# Altium footprint library 2.10-LQFP封装.PcbLib: 109 footprints (part 7 of 8)
Each footprint in its own frame and in the unit in brackets; x right, y up, seen from the top. Pads: shape width x height; smd on the part's side, far side on the other; paste and mask are expansions set on the pad; w line width, h text height; cw(c..) or ccw(c..) is an arc to the next point about the centre after c.
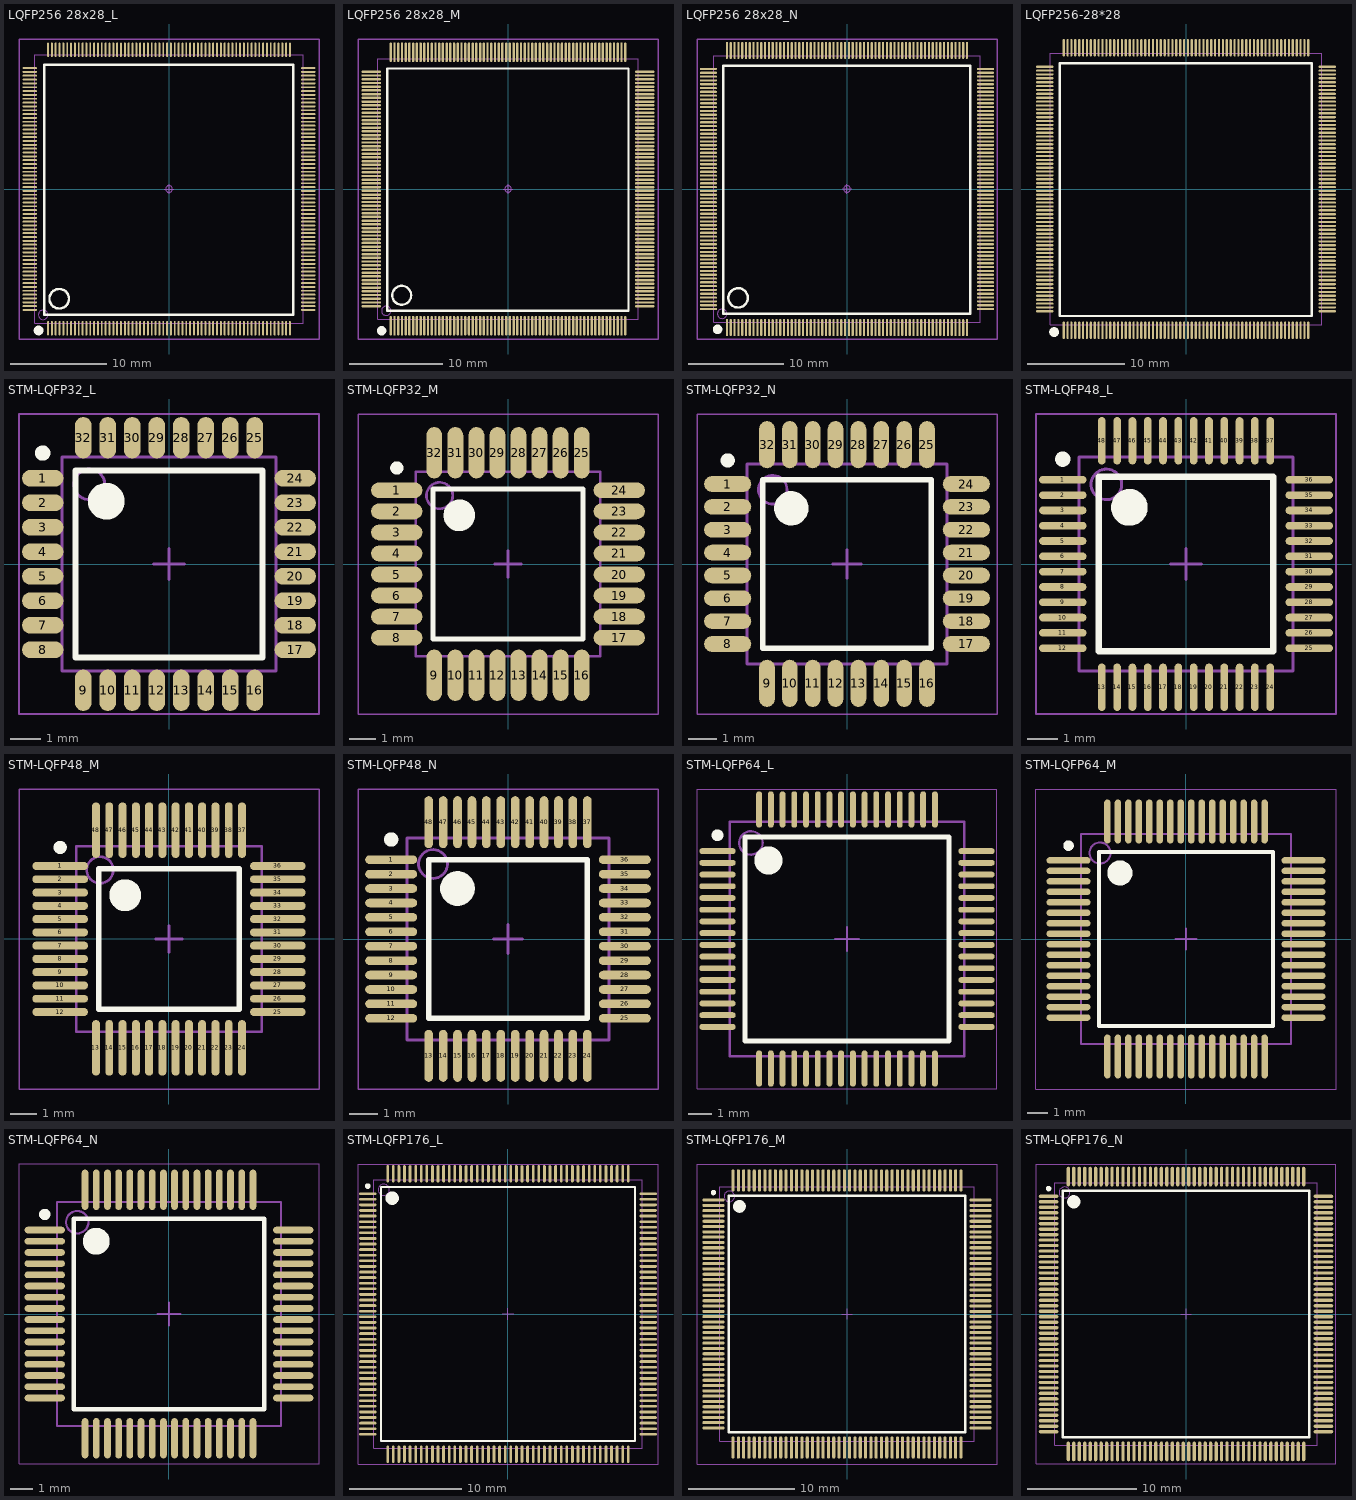
[diagram p6: the footprints below, top view; thin cyan lines are the x and y axes]

## LQFP256 28x28_L [mm] "256脚，体宽28x28mm，脚距0.4mm      [ PCB学习群514746572 ]"
pads (256):
  oval 0.2x1.5 smd: 1(-12.605,-14.497) 2(-12.205,-14.497) 3(-11.805,-14.497) 4(-11.405,-14.497) 5(-11.005,-14.497) 6(-10.605,-14.497) 7(-10.205,-14.497) 8(-9.805,-14.497) 9(-9.405,-14.497) 10(-9.005,-14.497) 11(-8.605,-14.497) 12(-8.205,-14.497) 13(-7.805,-14.497) 14(-7.405,-14.497) 15(-7.005,-14.497) 16(-6.605,-14.497) 17(-6.205,-14.497) 18(-5.805,-14.497) 19(-5.405,-14.497) 20(-5.005,-14.497) 21(-4.605,-14.497) 22(-4.205,-14.497) 23(-3.805,-14.497) 24(-3.405,-14.497) 25(-3.005,-14.497) 26(-2.605,-14.497) 27(-2.205,-14.497) 28(-1.805,-14.497) 29(-1.405,-14.497) 30(-1.005,-14.497) 31(-0.605,-14.497) 32(-0.205,-14.497) 33(0.195,-14.497) 34(0.595,-14.497) 35(0.995,-14.497) 36(1.395,-14.497) 37(1.795,-14.497) 38(2.195,-14.497) 39(2.595,-14.497) 40(2.995,-14.497) 41(3.395,-14.497) 42(3.795,-14.497) 43(4.195,-14.497) 44(4.595,-14.497) 45(4.995,-14.497) 46(5.395,-14.497) 47(5.795,-14.497) 48(6.195,-14.497) 49(6.595,-14.497) 50(6.995,-14.497) 51(7.395,-14.497) 52(7.795,-14.497) 53(8.195,-14.497) 54(8.595,-14.497) 55(8.995,-14.497) 56(9.395,-14.497) 57(9.795,-14.497) 58(10.195,-14.497) 59(10.595,-14.497) 60(10.995,-14.497) 61(11.395,-14.497) 62(11.795,-14.497) 63(12.195,-14.497) 64(12.595,-14.497) 129(12.595,14.5) 130(12.195,14.5) 131(11.795,14.5) 132(11.395,14.5) 133(10.995,14.5) 134(10.595,14.5) 135(10.195,14.5) 136(9.795,14.5) 137(9.395,14.5) 138(8.995,14.5) 139(8.595,14.5) 140(8.195,14.5) 141(7.795,14.5) 142(7.395,14.5) 143(6.995,14.5) 144(6.595,14.5) 145(6.195,14.5) 146(5.795,14.5) 147(5.395,14.5) 148(4.995,14.5) 149(4.595,14.5) 150(4.195,14.5) 151(3.795,14.5) 152(3.395,14.5) 153(2.995,14.5) 154(2.595,14.5) 155(2.195,14.5) 156(1.795,14.5) 157(1.395,14.5) 158(0.995,14.5) 159(0.595,14.5) 160(0.195,14.5) 161(-0.205,14.5) 162(-0.605,14.5) 163(-1.005,14.5) 164(-1.405,14.5) 165(-1.805,14.5) 166(-2.205,14.5) 167(-2.605,14.5) 168(-3.005,14.5) 169(-3.405,14.5) 170(-3.805,14.5) 171(-4.205,14.5) 172(-4.605,14.5) 173(-5.005,14.5) 174(-5.405,14.5) 175(-5.805,14.5) 176(-6.205,14.5) 177(-6.605,14.5) 178(-7.005,14.5) 179(-7.405,14.5) 180(-7.805,14.5) 181(-8.205,14.5) 182(-8.605,14.5) 183(-9.005,14.5) 184(-9.405,14.5) 185(-9.805,14.5) 186(-10.205,14.5) 187(-10.605,14.5) 188(-11.005,14.5) 189(-11.405,14.5) 190(-11.805,14.5) 191(-12.205,14.5) 192(-12.605,14.5)
  oval 1.5x0.2 smd: 65(14.493,-12.598) 66(14.493,-12.198) 67(14.493,-11.798) 68(14.493,-11.398) 69(14.493,-10.998) 70(14.493,-10.598) 71(14.493,-10.198) 72(14.493,-9.798) 73(14.493,-9.398) 74(14.493,-8.998) 75(14.493,-8.598) 76(14.493,-8.198) 77(14.493,-7.798) 78(14.493,-7.398) 79(14.493,-6.998) 80(14.493,-6.598) 81(14.493,-6.198) 82(14.493,-5.798) 83(14.493,-5.398) 84(14.493,-4.998) 85(14.493,-4.598) 86(14.493,-4.198) 87(14.493,-3.798) 88(14.493,-3.398) 89(14.493,-2.998) 90(14.493,-2.598) 91(14.493,-2.198) 92(14.493,-1.798) 93(14.493,-1.398) 94(14.493,-0.998) 95(14.493,-0.598) 96(14.493,-0.198) 97(14.493,0.202) 98(14.493,0.602) 99(14.493,1.002) 100(14.493,1.402) 101(14.493,1.802) 102(14.493,2.202) 103(14.493,2.602) 104(14.493,3.002) 105(14.493,3.402) 106(14.493,3.802) 107(14.493,4.202) 108(14.493,4.602) 109(14.493,5.002) 110(14.493,5.402) 111(14.493,5.802) 112(14.493,6.202) 113(14.493,6.602) 114(14.493,7.002) 115(14.493,7.402) 116(14.493,7.802) 117(14.493,8.202) 118(14.493,8.602) 119(14.493,9.002) 120(14.493,9.402) 121(14.493,9.802) 122(14.493,10.202) 123(14.493,10.602) 124(14.493,11.002) 125(14.493,11.402) 126(14.493,11.802) 127(14.493,12.202) 128(14.493,12.602) 193(-14.503,12.602) 194(-14.503,12.202) 195(-14.503,11.802) 196(-14.503,11.402) 197(-14.503,11.002) 198(-14.503,10.602) 199(-14.503,10.202) 200(-14.503,9.802) 201(-14.503,9.402) 202(-14.503,9.002) 203(-14.503,8.602) 204(-14.503,8.202) 205(-14.503,7.802) 206(-14.503,7.402) 207(-14.503,7.002) 208(-14.503,6.602) 209(-14.503,6.202) 210(-14.503,5.802) 211(-14.503,5.402) 212(-14.503,5.002) 213(-14.503,4.602) 214(-14.503,4.202) 215(-14.503,3.802) 216(-14.503,3.402) 217(-14.503,3.002) 218(-14.503,2.602) 219(-14.503,2.202) 220(-14.503,1.802) 221(-14.503,1.402) 222(-14.503,1.002) 223(-14.503,0.602) 224(-14.503,0.202) 225(-14.503,-0.198) 226(-14.503,-0.598) 227(-14.503,-0.998) 228(-14.503,-1.398) 229(-14.503,-1.798) 230(-14.503,-2.198) 231(-14.503,-2.598) 232(-14.503,-2.998) 233(-14.503,-3.398) 234(-14.503,-3.798) 235(-14.503,-4.198) 236(-14.503,-4.598) 237(-14.503,-4.998) 238(-14.503,-5.398) 239(-14.503,-5.798) 240(-14.503,-6.198) 241(-14.503,-6.598) 242(-14.503,-6.998) 243(-14.503,-7.398) 244(-14.503,-7.798) 245(-14.503,-8.198) 246(-14.503,-8.598) 247(-14.503,-8.998) 248(-14.503,-9.398) 249(-14.503,-9.798) 250(-14.503,-10.198) 251(-14.503,-10.598) 252(-14.503,-10.998) 253(-14.503,-11.398) 254(-14.503,-11.798) 255(-14.503,-12.198) 256(-14.503,-12.598)
Top Overlay:
  circle w0.508: c-13.589,-14.732 r0.25
  circle w0.254: c-11.435,-11.428 r1.016
  lines w0.254: -13.005,-13.079 12.949,-13.079 12.949,12.956 -13.005,12.956 -13.005,-13.079
Mechanical 13:
  circle w0.1: c-13.105,-13.098 r0.5
  lines w0.1: -14.005,-13.998 13.995,-13.998 13.995,14.002 -14.005,14.002 -14.005,-13.998
Mechanical 15:
  circle w0.05: c-0.005,0.002 r0.35
  lines w0.05: -0.505,0.002 0.495,0.002 ; -0.005,-0.498 -0.005,0.502
  lines w0.15: -15.626,-15.619 15.616,-15.619 15.616,15.623 -15.626,15.623 -15.626,-15.619
3D body "lqfp256-28x28_asm-22.stp": height 1.45, standoff 0, extent -15.003,-15.003 15.003,15.003

## LQFP256 28x28_M [mm] "256脚，体宽28x28mm，脚距0.4mm      [ PCB学习群514746572 ]"
pads (256):
  oval 0.26x2.1 smd: 1(-12.6,-14.702) 2(-12.2,-14.702) 3(-11.8,-14.702) 4(-11.4,-14.702) 5(-11,-14.702) 6(-10.6,-14.702) 7(-10.2,-14.702) 8(-9.8,-14.702) 9(-9.4,-14.702) 10(-9,-14.702) 11(-8.6,-14.702) 12(-8.2,-14.702) 13(-7.8,-14.702) 14(-7.4,-14.702) 15(-7,-14.702) 16(-6.6,-14.702) 17(-6.2,-14.702) 18(-5.8,-14.702) 19(-5.4,-14.702) 20(-5,-14.702) 21(-4.6,-14.702) 22(-4.2,-14.702) 23(-3.8,-14.702) 24(-3.4,-14.702) 25(-3,-14.702) 26(-2.6,-14.702) 27(-2.2,-14.702) 28(-1.8,-14.702) 29(-1.4,-14.702) 30(-1,-14.702) 31(-0.6,-14.702) 32(-0.2,-14.702) 33(0.2,-14.702) 34(0.6,-14.702) 35(1,-14.702) 36(1.4,-14.702) 37(1.8,-14.702) 38(2.2,-14.702) 39(2.6,-14.702) 40(3,-14.702) 41(3.4,-14.702) 42(3.8,-14.702) 43(4.2,-14.702) 44(4.6,-14.702) 45(5,-14.702) 46(5.4,-14.702) 47(5.8,-14.702) 48(6.2,-14.702) 49(6.6,-14.702) 50(7,-14.702) 51(7.4,-14.702) 52(7.8,-14.702) 53(8.2,-14.702) 54(8.6,-14.702) 55(9,-14.702) 56(9.4,-14.702) 57(9.8,-14.702) 58(10.2,-14.702) 59(10.6,-14.702) 60(11,-14.702) 61(11.4,-14.702) 62(11.8,-14.702) 63(12.2,-14.702) 64(12.6,-14.702) 129(12.6,14.702) 130(12.2,14.702) 131(11.8,14.702) 132(11.4,14.702) 133(11,14.702) 134(10.6,14.702) 135(10.2,14.702) 136(9.8,14.702) 137(9.4,14.702) 138(9,14.702) 139(8.6,14.702) 140(8.2,14.702) 141(7.8,14.702) 142(7.4,14.702) 143(7,14.702) 144(6.6,14.702) 145(6.2,14.702) 146(5.8,14.702) 147(5.4,14.702) 148(5,14.702) 149(4.6,14.702) 150(4.2,14.702) 151(3.8,14.702) 152(3.4,14.702) 153(3,14.702) 154(2.6,14.702) 155(2.2,14.702) 156(1.8,14.702) 157(1.4,14.702) 158(1,14.702) 159(0.6,14.702) 160(0.2,14.702) 161(-0.2,14.702) 162(-0.6,14.702) 163(-1,14.702) 164(-1.4,14.702) 165(-1.8,14.702) 166(-2.2,14.702) 167(-2.6,14.702) 168(-3,14.702) 169(-3.4,14.702) 170(-3.8,14.702) 171(-4.2,14.702) 172(-4.6,14.702) 173(-5,14.702) 174(-5.4,14.702) 175(-5.8,14.702) 176(-6.2,14.702) 177(-6.6,14.702) 178(-7,14.702) 179(-7.4,14.702) 180(-7.8,14.702) 181(-8.2,14.702) 182(-8.6,14.702) 183(-9,14.702) 184(-9.4,14.702) 185(-9.8,14.702) 186(-10.2,14.702) 187(-10.6,14.702) 188(-11,14.702) 189(-11.4,14.702) 190(-11.8,14.702) 191(-12.2,14.702) 192(-12.6,14.702)
  oval 2.1x0.26 smd: 65(14.702,-12.6) 66(14.702,-12.2) 67(14.702,-11.8) 68(14.702,-11.4) 69(14.702,-11) 70(14.702,-10.6) 71(14.702,-10.2) 72(14.702,-9.8) 73(14.702,-9.4) 74(14.702,-9) 75(14.702,-8.6) 76(14.702,-8.2) 77(14.702,-7.8) 78(14.702,-7.4) 79(14.702,-7) 80(14.702,-6.6) 81(14.702,-6.2) 82(14.702,-5.8) 83(14.702,-5.4) 84(14.702,-5) 85(14.702,-4.6) 86(14.702,-4.2) 87(14.702,-3.8) 88(14.702,-3.4) 89(14.702,-3) 90(14.702,-2.6) 91(14.702,-2.2) 92(14.702,-1.8) 93(14.702,-1.4) 94(14.702,-1) 95(14.702,-0.6) 96(14.702,-0.2) 97(14.702,0.2) 98(14.702,0.6) 99(14.702,1) 100(14.702,1.4) 101(14.702,1.8) 102(14.702,2.2) 103(14.702,2.6) 104(14.702,3) 105(14.702,3.4) 106(14.702,3.8) 107(14.702,4.2) 108(14.702,4.6) 109(14.702,5) 110(14.702,5.4) 111(14.702,5.8) 112(14.702,6.2) 113(14.702,6.6) 114(14.702,7) 115(14.702,7.4) 116(14.702,7.8) 117(14.702,8.2) 118(14.702,8.6) 119(14.702,9) 120(14.702,9.4) 121(14.702,9.8) 122(14.702,10.2) 123(14.702,10.6) 124(14.702,11) 125(14.702,11.4) 126(14.702,11.8) 127(14.702,12.2) 128(14.702,12.6) 193(-14.702,12.6) 194(-14.702,12.2) 195(-14.702,11.8) 196(-14.702,11.4) 197(-14.702,11) 198(-14.702,10.6) 199(-14.702,10.2) 200(-14.702,9.8) 201(-14.702,9.4) 202(-14.702,9) 203(-14.702,8.6) 204(-14.702,8.2) 205(-14.702,7.8) 206(-14.702,7.4) 207(-14.702,7) 208(-14.702,6.6) 209(-14.702,6.2) 210(-14.702,5.8) 211(-14.702,5.4) 212(-14.702,5) 213(-14.702,4.6) 214(-14.702,4.2) 215(-14.702,3.8) 216(-14.702,3.4) 217(-14.702,3) 218(-14.702,2.6) 219(-14.702,2.2) 220(-14.702,1.8) 221(-14.702,1.4) 222(-14.702,1) 223(-14.702,0.6) 224(-14.702,0.2) 225(-14.702,-0.2) 226(-14.702,-0.6) 227(-14.702,-1) 228(-14.702,-1.4) 229(-14.702,-1.8) 230(-14.702,-2.2) 231(-14.702,-2.6) 232(-14.702,-3) 233(-14.702,-3.4) 234(-14.702,-3.8) 235(-14.702,-4.2) 236(-14.702,-4.6) 237(-14.702,-5) 238(-14.702,-5.4) 239(-14.702,-5.8) 240(-14.702,-6.2) 241(-14.702,-6.6) 242(-14.702,-7) 243(-14.702,-7.4) 244(-14.702,-7.8) 245(-14.702,-8.2) 246(-14.702,-8.6) 247(-14.702,-9) 248(-14.702,-9.4) 249(-14.702,-9.8) 250(-14.702,-10.2) 251(-14.702,-10.6) 252(-14.702,-11) 253(-14.702,-11.4) 254(-14.702,-11.8) 255(-14.702,-12.2) 256(-14.702,-12.6)
Top Overlay:
  circle w0.508: c-13.589,-15.24 r0.25
  circle w0.254: c-11.43,-11.43 r1.016
  lines w0.254: -13,-13.081 12.954,-13.081 12.954,12.954 -13,12.954 -13,-13.081
Mechanical 13:
  circle w0.1: c-13.1,-13.1 r0.5
  lines w0.1: -14,-14 14,-14 14,14 -14,14 -14,-14
Mechanical 15:
  circle w0.05: c0,0 r0.35
  lines w0.05: -0.5,0 0.5,0 ; 0,-0.5 0,0.5
  lines w0.15: -16.129,-16.129 16.129,-16.129 16.129,16.129 -16.129,16.129 -16.129,-16.129
3D body "LQFP256-28x28.STEP": height 1.45, standoff 0, extent -15.003,-15.003 15.003,15.003

## LQFP256 28x28_N [mm] "256脚，体宽28x28mm，脚距0.4mm     [ PCB学习群514746572 ]"
pads (256):
  oval 0.23x1.8 smd: 1(-12.605,-14.548) 2(-12.205,-14.548) 3(-11.805,-14.548) 4(-11.405,-14.548) 5(-11.005,-14.548) 6(-10.605,-14.548) 7(-10.205,-14.548) 8(-9.805,-14.548) 9(-9.405,-14.548) 10(-9.005,-14.548) 11(-8.605,-14.548) 12(-8.205,-14.548) 13(-7.805,-14.548) 14(-7.405,-14.548) 15(-7.005,-14.548) 16(-6.605,-14.548) 17(-6.205,-14.548) 18(-5.805,-14.548) 19(-5.405,-14.548) 20(-5.005,-14.548) 21(-4.605,-14.548) 22(-4.205,-14.548) 23(-3.805,-14.548) 24(-3.405,-14.548) 25(-3.005,-14.548) 26(-2.605,-14.548) 27(-2.205,-14.548) 28(-1.805,-14.548) 29(-1.405,-14.548) 30(-1.005,-14.548) 31(-0.605,-14.548) 32(-0.205,-14.548) 33(0.195,-14.548) 34(0.595,-14.548) 35(0.995,-14.548) 36(1.395,-14.548) 37(1.795,-14.548) 38(2.195,-14.548) 39(2.595,-14.548) 40(2.995,-14.548) 41(3.395,-14.548) 42(3.795,-14.548) 43(4.195,-14.548) 44(4.595,-14.548) 45(4.995,-14.548) 46(5.395,-14.548) 47(5.795,-14.548) 48(6.195,-14.548) 49(6.595,-14.548) 50(6.995,-14.548) 51(7.395,-14.548) 52(7.795,-14.548) 53(8.195,-14.548) 54(8.595,-14.548) 55(8.995,-14.548) 56(9.395,-14.548) 57(9.795,-14.548) 58(10.195,-14.548) 59(10.595,-14.548) 60(10.995,-14.548) 61(11.395,-14.548) 62(11.795,-14.548) 63(12.195,-14.548) 64(12.595,-14.548) 129(12.595,14.551) 130(12.195,14.551) 131(11.795,14.551) 132(11.395,14.551) 133(10.995,14.551) 134(10.595,14.551) 135(10.195,14.551) 136(9.795,14.551) 137(9.395,14.551) 138(8.995,14.551) 139(8.595,14.551) 140(8.195,14.551) 141(7.795,14.551) 142(7.395,14.551) 143(6.995,14.551) 144(6.595,14.551) 145(6.195,14.551) 146(5.795,14.551) 147(5.395,14.551) 148(4.995,14.551) 149(4.595,14.551) 150(4.195,14.551) 151(3.795,14.551) 152(3.395,14.551) 153(2.995,14.551) 154(2.595,14.551) 155(2.195,14.551) 156(1.795,14.551) 157(1.395,14.551) 158(0.995,14.551) 159(0.595,14.551) 160(0.195,14.551) 161(-0.205,14.551) 162(-0.605,14.551) 163(-1.005,14.551) 164(-1.405,14.551) 165(-1.805,14.551) 166(-2.205,14.551) 167(-2.605,14.551) 168(-3.005,14.551) 169(-3.405,14.551) 170(-3.805,14.551) 171(-4.205,14.551) 172(-4.605,14.551) 173(-5.005,14.551) 174(-5.405,14.551) 175(-5.805,14.551) 176(-6.205,14.551) 177(-6.605,14.551) 178(-7.005,14.551) 179(-7.405,14.551) 180(-7.805,14.551) 181(-8.205,14.551) 182(-8.605,14.551) 183(-9.005,14.551) 184(-9.405,14.551) 185(-9.805,14.551) 186(-10.205,14.551) 187(-10.605,14.551) 188(-11.005,14.551) 189(-11.405,14.551) 190(-11.805,14.551) 191(-12.205,14.551) 192(-12.605,14.551)
  oval 1.8x0.23 smd: 65(14.544,-12.598) 66(14.544,-12.198) 67(14.544,-11.798) 68(14.544,-11.398) 69(14.544,-10.998) 70(14.544,-10.598) 71(14.544,-10.198) 72(14.544,-9.798) 73(14.544,-9.398) 74(14.544,-8.998) 75(14.544,-8.598) 76(14.544,-8.198) 77(14.544,-7.798) 78(14.544,-7.398) 79(14.544,-6.998) 80(14.544,-6.598) 81(14.544,-6.198) 82(14.544,-5.798) 83(14.544,-5.398) 84(14.544,-4.998) 85(14.544,-4.598) 86(14.544,-4.198) 87(14.544,-3.798) 88(14.544,-3.398) 89(14.544,-2.998) 90(14.544,-2.598) 91(14.544,-2.198) 92(14.544,-1.798) 93(14.544,-1.398) 94(14.544,-0.998) 95(14.544,-0.598) 96(14.544,-0.198) 97(14.544,0.202) 98(14.544,0.602) 99(14.544,1.002) 100(14.544,1.402) 101(14.544,1.802) 102(14.544,2.202) 103(14.544,2.602) 104(14.544,3.002) 105(14.544,3.402) 106(14.544,3.802) 107(14.544,4.202) 108(14.544,4.602) 109(14.544,5.002) 110(14.544,5.402) 111(14.544,5.802) 112(14.544,6.202) 113(14.544,6.602) 114(14.544,7.002) 115(14.544,7.402) 116(14.544,7.802) 117(14.544,8.202) 118(14.544,8.602) 119(14.544,9.002) 120(14.544,9.402) 121(14.544,9.802) 122(14.544,10.202) 123(14.544,10.602) 124(14.544,11.002) 125(14.544,11.402) 126(14.544,11.802) 127(14.544,12.202) 128(14.544,12.602) 193(-14.554,12.602) 194(-14.554,12.202) 195(-14.554,11.802) 196(-14.554,11.402) 197(-14.554,11.002) 198(-14.554,10.602) 199(-14.554,10.202) 200(-14.554,9.802) 201(-14.554,9.402) 202(-14.554,9.002) 203(-14.554,8.602) 204(-14.554,8.202) 205(-14.554,7.802) 206(-14.554,7.402) 207(-14.554,7.002) 208(-14.554,6.602) 209(-14.554,6.202) 210(-14.554,5.802) 211(-14.554,5.402) 212(-14.554,5.002) 213(-14.554,4.602) 214(-14.554,4.202) 215(-14.554,3.802) 216(-14.554,3.402) 217(-14.554,3.002) 218(-14.554,2.602) 219(-14.554,2.202) 220(-14.554,1.802) 221(-14.554,1.402) 222(-14.554,1.002) 223(-14.554,0.602) 224(-14.554,0.202) 225(-14.554,-0.198) 226(-14.554,-0.598) 227(-14.554,-0.998) 228(-14.554,-1.398) 229(-14.554,-1.798) 230(-14.554,-2.198) 231(-14.554,-2.598) 232(-14.554,-2.998) 233(-14.554,-3.398) 234(-14.554,-3.798) 235(-14.554,-4.198) 236(-14.554,-4.598) 237(-14.554,-4.998) 238(-14.554,-5.398) 239(-14.554,-5.798) 240(-14.554,-6.198) 241(-14.554,-6.598) 242(-14.554,-6.998) 243(-14.554,-7.398) 244(-14.554,-7.798) 245(-14.554,-8.198) 246(-14.554,-8.598) 247(-14.554,-8.998) 248(-14.554,-9.398) 249(-14.554,-9.798) 250(-14.554,-10.198) 251(-14.554,-10.598) 252(-14.554,-10.998) 253(-14.554,-11.398) 254(-14.554,-11.798) 255(-14.554,-12.198) 256(-14.554,-12.598)
Top Overlay:
  circle w0.508: c-13.589,-14.732 r0.25
  circle w0.254: c-11.435,-11.428 r1.016
  lines w0.254: -13.005,-13.079 12.949,-13.079 12.949,12.956 -13.005,12.956 -13.005,-13.079
Mechanical 13:
  circle w0.1: c-13.105,-13.098 r0.5
  lines w0.1: -14.005,-13.998 13.995,-13.998 13.995,14.002 -14.005,14.002 -14.005,-13.998
Mechanical 15:
  circle w0.05: c-0.005,0.002 r0.35
  lines w0.05: -0.505,0.002 0.495,0.002 ; -0.005,-0.498 -0.005,0.502
  lines w0.15: -15.748,-15.748 15.748,-15.748 15.748,15.748 -15.748,15.748 -15.748,-15.748
3D body "LQFP256-28x28.STEP": height 1.45, standoff 0, extent -15.003,-15.003 15.003,15.003

## LQFP256-28*28 [mm] "28x28mm，0.4mm      [ PCB学习群514746572 ]"
pads (256):
  oval 0.23x1.8 smd: 1(-12.605,-14.548) 2(-12.205,-14.548) 3(-11.805,-14.548) 4(-11.405,-14.548) 5(-11.005,-14.548) 6(-10.605,-14.548) 7(-10.205,-14.548) 8(-9.805,-14.548) 9(-9.405,-14.548) 10(-9.005,-14.548) 11(-8.605,-14.548) 12(-8.205,-14.548) 13(-7.805,-14.548) 14(-7.405,-14.548) 15(-7.005,-14.548) 16(-6.605,-14.548) 17(-6.205,-14.548) 18(-5.805,-14.548) 19(-5.405,-14.548) 20(-5.005,-14.548) 21(-4.605,-14.548) 22(-4.205,-14.548) 23(-3.805,-14.548) 24(-3.405,-14.548) 25(-3.005,-14.548) 26(-2.605,-14.548) 27(-2.205,-14.548) 28(-1.805,-14.548) 29(-1.405,-14.548) 30(-1.005,-14.548) 31(-0.605,-14.548) 32(-0.205,-14.548) 33(0.195,-14.548) 34(0.595,-14.548) 35(0.995,-14.548) 36(1.395,-14.548) 37(1.795,-14.548) 38(2.195,-14.548) 39(2.595,-14.548) 40(2.995,-14.548) 41(3.395,-14.548) 42(3.795,-14.548) 43(4.195,-14.548) 44(4.595,-14.548) 45(4.995,-14.548) 46(5.395,-14.548) 47(5.795,-14.548) 48(6.195,-14.548) 49(6.595,-14.548) 50(6.995,-14.548) 51(7.395,-14.548) 52(7.795,-14.548) 53(8.195,-14.548) 54(8.595,-14.548) 55(8.995,-14.548) 56(9.395,-14.548) 57(9.795,-14.548) 58(10.195,-14.548) 59(10.595,-14.548) 60(10.995,-14.548) 61(11.395,-14.548) 62(11.795,-14.548) 63(12.195,-14.548) 64(12.595,-14.548) 129(12.595,14.551) 130(12.195,14.551) 131(11.795,14.551) 132(11.395,14.551) 133(10.995,14.551) 134(10.595,14.551) 135(10.195,14.551) 136(9.795,14.551) 137(9.395,14.551) 138(8.995,14.551) 139(8.595,14.551) 140(8.195,14.551) 141(7.795,14.551) 142(7.395,14.551) 143(6.995,14.551) 144(6.595,14.551) 145(6.195,14.551) 146(5.795,14.551) 147(5.395,14.551) 148(4.995,14.551) 149(4.595,14.551) 150(4.195,14.551) 151(3.795,14.551) 152(3.395,14.551) 153(2.995,14.551) 154(2.595,14.551) 155(2.195,14.551) 156(1.795,14.551) 157(1.395,14.551) 158(0.995,14.551) 159(0.595,14.551) 160(0.195,14.551) 161(-0.205,14.551) 162(-0.605,14.551) 163(-1.005,14.551) 164(-1.405,14.551) 165(-1.805,14.551) 166(-2.205,14.551) 167(-2.605,14.551) 168(-3.005,14.551) 169(-3.405,14.551) 170(-3.805,14.551) 171(-4.205,14.551) 172(-4.605,14.551) 173(-5.005,14.551) 174(-5.405,14.551) 175(-5.805,14.551) 176(-6.205,14.551) 177(-6.605,14.551) 178(-7.005,14.551) 179(-7.405,14.551) 180(-7.805,14.551) 181(-8.205,14.551) 182(-8.605,14.551) 183(-9.005,14.551) 184(-9.405,14.551) 185(-9.805,14.551) 186(-10.205,14.551) 187(-10.605,14.551) 188(-11.005,14.551) 189(-11.405,14.551) 190(-11.805,14.551) 191(-12.205,14.551) 192(-12.605,14.551)
  oval 1.8x0.23 smd: 65(14.544,-12.598) 66(14.544,-12.198) 67(14.544,-11.798) 68(14.544,-11.398) 69(14.544,-10.998) 70(14.544,-10.598) 71(14.544,-10.198) 72(14.544,-9.798) 73(14.544,-9.398) 74(14.544,-8.998) 75(14.544,-8.598) 76(14.544,-8.198) 77(14.544,-7.798) 78(14.544,-7.398) 79(14.544,-6.998) 80(14.544,-6.598) 81(14.544,-6.198) 82(14.544,-5.798) 83(14.544,-5.398) 84(14.544,-4.998) 85(14.544,-4.598) 86(14.544,-4.198) 87(14.544,-3.798) 88(14.544,-3.398) 89(14.544,-2.998) 90(14.544,-2.598) 91(14.544,-2.198) 92(14.544,-1.798) 93(14.544,-1.398) 94(14.544,-0.998) 95(14.544,-0.598) 96(14.544,-0.198) 97(14.544,0.202) 98(14.544,0.602) 99(14.544,1.002) 100(14.544,1.402) 101(14.544,1.802) 102(14.544,2.202) 103(14.544,2.602) 104(14.544,3.002) 105(14.544,3.402) 106(14.544,3.802) 107(14.544,4.202) 108(14.544,4.602) 109(14.544,5.002) 110(14.544,5.402) 111(14.544,5.802) 112(14.544,6.202) 113(14.544,6.602) 114(14.544,7.002) 115(14.544,7.402) 116(14.544,7.802) 117(14.544,8.202) 118(14.544,8.602) 119(14.544,9.002) 120(14.544,9.402) 121(14.544,9.802) 122(14.544,10.202) 123(14.544,10.602) 124(14.544,11.002) 125(14.544,11.402) 126(14.544,11.802) 127(14.544,12.202) 128(14.544,12.602) 193(-14.554,12.602) 194(-14.554,12.202) 195(-14.554,11.802) 196(-14.554,11.402) 197(-14.554,11.002) 198(-14.554,10.602) 199(-14.554,10.202) 200(-14.554,9.802) 201(-14.554,9.402) 202(-14.554,9.002) 203(-14.554,8.602) 204(-14.554,8.202) 205(-14.554,7.802) 206(-14.554,7.402) 207(-14.554,7.002) 208(-14.554,6.602) 209(-14.554,6.202) 210(-14.554,5.802) 211(-14.554,5.402) 212(-14.554,5.002) 213(-14.554,4.602) 214(-14.554,4.202) 215(-14.554,3.802) 216(-14.554,3.402) 217(-14.554,3.002) 218(-14.554,2.602) 219(-14.554,2.202) 220(-14.554,1.802) 221(-14.554,1.402) 222(-14.554,1.002) 223(-14.554,0.602) 224(-14.554,0.202) 225(-14.554,-0.198) 226(-14.554,-0.598) 227(-14.554,-0.998) 228(-14.554,-1.398) 229(-14.554,-1.798) 230(-14.554,-2.198) 231(-14.554,-2.598) 232(-14.554,-2.998) 233(-14.554,-3.398) 234(-14.554,-3.798) 235(-14.554,-4.198) 236(-14.554,-4.598) 237(-14.554,-4.998) 238(-14.554,-5.398) 239(-14.554,-5.798) 240(-14.554,-6.198) 241(-14.554,-6.598) 242(-14.554,-6.998) 243(-14.554,-7.398) 244(-14.554,-7.798) 245(-14.554,-8.198) 246(-14.554,-8.598) 247(-14.554,-8.998) 248(-14.554,-9.398) 249(-14.554,-9.798) 250(-14.554,-10.198) 251(-14.554,-10.598) 252(-14.554,-10.998) 253(-14.554,-11.398) 254(-14.554,-11.798) 255(-14.554,-12.198) 256(-14.554,-12.598)